# Altium footprint library DBLib.PcbLib: 99 footprints (part 4 of 7)
Each footprint in its own frame and in the unit in brackets; x right, y up, seen from the top. Pads: shape width x height; smd on the part's side, far side on the other; paste and mask are expansions set on the pad; w line width, h text height; cw(c..) or ccw(c..) is an arc to the next point about the centre after c.
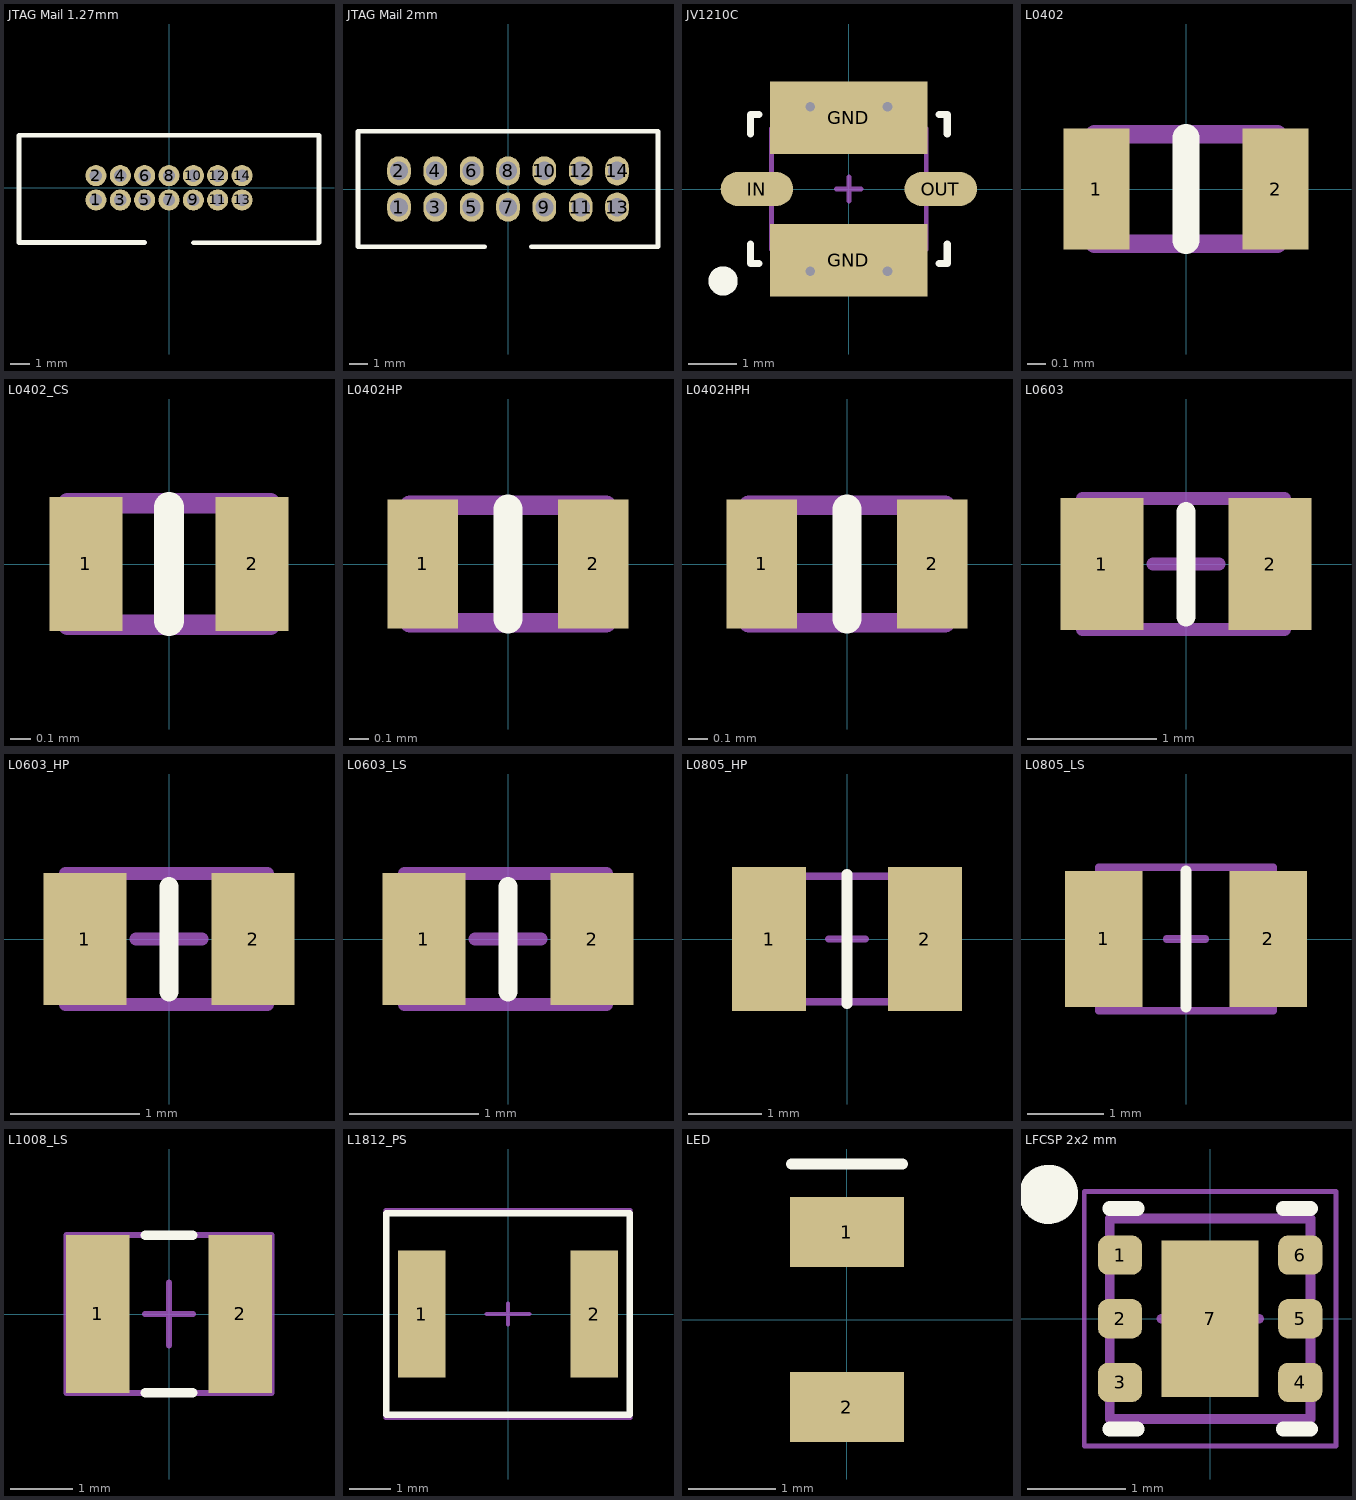
[diagram p3: the footprints below, top view; thin cyan lines are the x and y axes]

## JTAG Mail 1.27mm [mm]
height 2.9
pads (14):
  round 1.1 hole 0.65: 1(-3.81,-0.635) 2(-3.81,0.635) 3(-2.54,-0.635) 4(-2.54,0.635) 5(-1.27,-0.635) 6(-1.27,0.635) 7(0,-0.635) 8(0,0.635) 9(1.27,-0.635) 10(1.27,0.635) 11(2.54,-0.635) 12(2.54,0.635) 13(3.81,-0.635) 14(3.81,0.635)
Top Overlay:
  lines w0.254: -1.27,-2.855 -7.823,-2.855 -7.823,2.743 7.823,2.743 7.823,-2.866 1.27,-2.866
3D body "User Library-CONB127P-2R-20W_TH.step": height 5.4, standoff -2.1, extent -7.595,-2.65 7.595,2.55

## JTAG Mail 2mm [mm] "2.00mm Pitch, Milli-Grid PCB Header, Dual Row, Vertical, Through Hole, Shrouded, 14  Circuits"
height 2.9
pads (14):
  oval 1.3x1.6 hole 1: 1(-6,-1) 2(-6,1) 3(-4,-1) 4(-4,1) 5(-2,-1) 6(-2,1) 7(0,-1) 8(0,1) 9(2,-1) 10(2,1) 11(4,-1) 12(4,1) 13(6,-1) 14(6,1)
Top Overlay:
  lines w0.254: -1.27,-3.175 -8.255,-3.175 -8.255,3.175 8.255,3.175 8.255,-3.175 1.27,-3.175
3D body "878311421.stp": height 6.45, standoff -2.45, extent -8.325,-3.15 8.325,3.15

## JV1210C [mm] "Bandpass Filter"
height 1.5
pads (4):
  rect 3.25x1.5 smd: GND(0,-1.475) GND(0,1.475)
  oval 1.5x0.7 smd: IN(-1.9,0) OUT(1.9,0)
via 0.8,1.7 diameter 0.5 hole 0.2
via -0.8,1.7 diameter 0.5 hole 0.2
via 0.8,-1.7 diameter 0.5 hole 0.2
via -0.8,-1.7 diameter 0.5 hole 0.2
Top Overlay:
  circle w0.35: c-2.6,-1.9 r0.127
  lines w0.15: -2.032,-1.138 -2.032,-1.538 -1.863,-1.538 ; -2.032,1.138 -2.032,1.538 -1.863,1.538 ; 1.863,-1.538 2.032,-1.538 2.032,-1.138 ; 1.863,1.538 2.032,1.538 2.032,1.138
Mechanical 1:
  lines w0.1: -0.254,0 0.254,0 ; 0,-0.254 0,0.254 ; -1.6,-1.25 1.6,-1.25 1.6,1.25 -1.6,1.25 -1.6,-1.25
3D body "User Library-CAPC3225X13.step": height 1.3, standoff 0, extent -1.6,-1.25 1.6,1.25

## L0402 [mm]
height 1.3
pads (2):
  rect 0.36x0.66 smd: 1(-0.49,0) 2(0.49,0)
Top Overlay:
  lines w0.15: 0,-0.279 0,0.279
Mechanical 1:
  lines w0.1: -0.5,-0.3 0.5,-0.3 0.5,0.3 -0.5,0.3 -0.5,-0.3
3D body "Coilcraft-0402DF.step": height 0.66, standoff 0, extent -0.559,-0.325 0.559,0.335

## L0402_CS [mm]
height 1.3
pads (2):
  rect 0.36x0.66 smd: 1(-0.41,0) 2(0.41,0)
Top Overlay:
  lines w0.15: 0,-0.279 0,0.279
Mechanical 1:
  lines w0.1: -0.5,-0.3 0.5,-0.3 0.5,0.3 -0.5,0.3 -0.5,-0.3
3D body "Coilcraft-0402CS.step": height 0.65, standoff -0.01, extent -0.593,-0.318 0.593,0.318

## L0402HP [mm]
height 1.3
pads (2):
  rect 0.36x0.66 smd: 1(-0.435,0) 2(0.435,0)
Top Overlay:
  lines w0.15: 0,-0.279 0,0.279
Mechanical 1:
  lines w0.1: -0.5,-0.3 -0.5,0.3 0.5,0.3 0.5,-0.3 -0.5,-0.3
3D body "Ind_Coilcraft_0402HP-22NXGLU_eec.STEP": height 0.61, standoff 0, extent -0.546,-0.305 0.546,0.305

## L0402HPH [mm]
height 1.3
pads (2):
  rect 0.36x0.66 smd: 1(-0.435,0) 2(0.435,0)
Top Overlay:
  lines w0.15: 0,-0.279 0,0.279
Mechanical 1:
  lines w0.1: -0.5,-0.3 0.5,-0.3 0.5,0.3 -0.5,0.3 -0.5,-0.3
3D body "Ind_Coilcraft_0402HPH-R10XJLU_eec.STEP": height 0.6, standoff -0.01, extent -0.56,-0.325 0.56,0.335

## L0603 [mm]
height 1.3
pads (2):
  rect 0.64x1.02 smd: 1(-0.65,0) 2(0.65,0)
Top Overlay:
  lines w0.15: 0,-0.406 0,0.406
Mechanical 1:
  lines w0.1: -0.254,0 0.254,0 ; 0,-0.254 0,0.254 ; -0.8,-0.508 0.762,-0.508 0.762,0.508 -0.8,0.508 -0.8,-0.508
3D body "User Library-SLF_0603.step": height 1, standoff -0.02, extent -0.9,-0.56 0.9,0.56

## L0603_HP [mm]
height 1.3
pads (2):
  rect 0.64x1.02 smd: 1(-0.65,0) 2(0.65,0)
Top Overlay:
  lines w0.15: 0,-0.406 0,0.406
Mechanical 1:
  lines w0.1: -0.254,0 0.254,0 ; 0,-0.254 0,0.254 ; -0.8,-0.508 0.762,-0.508 0.762,0.508 -0.8,0.508 -0.8,-0.508
3D body "Coilcraft-0603HP.step": height 0.93, standoff -0.01, extent -0.875,-0.545 0.875,0.545

## L0603_LS [mm]
height 1.3
pads (2):
  rect 0.64x1.02 smd: 1(-0.65,0) 2(0.65,0)
Top Overlay:
  lines w0.15: 0,-0.406 0,0.406
Mechanical 1:
  lines w0.1: -0.254,0 0.254,0 ; 0,-0.254 0,0.254 ; -0.8,-0.508 -0.8,0.508 0.762,0.508 0.762,-0.508 -0.8,-0.508
3D body "Coilcraft-0603LS.step": height 1.11, standoff -0.01, extent -0.901,-0.584 0.901,0.585

## L0805_HP [mm]
height 1.3
pads (2):
  rect 1.02x1.98 smd: 1(-1.07,0) 2(1.07,0)
Top Overlay:
  lines w0.15: 0,-0.889 0,0.889
Mechanical 1:
  lines w0.1: -0.254,0 0.254,0 ; 0,-0.254 0,0.254 ; -1.145,-0.862 1.144,-0.862 1.144,0.863 -1.145,0.863 -1.145,-0.862
3D body "Coilcraft-0805CS.step": height 1.51, standoff -0.01, extent -1.145,-0.862 1.144,0.863

## L0805_LS [mm]
height 1.3
pads (2):
  rect 1.02x1.78 smd: 1(-1.08,0) 2(1.08,0)
Top Overlay:
  lines w0.15: 0,-0.889 0,0.889
Mechanical 1:
  lines w0.1: -0.254,0 0.254,0 ; 0,-0.254 0,0.254 ; -1.145,-0.94 1.144,-0.94 1.144,0.94 -1.145,0.94 -1.145,-0.94
3D body "Coilcraft-0805LS.step": height 1.59, standoff -0.01, extent -1.145,-0.955 1.145,0.955

## L1008_LS [mm]
height 1.3
pads (2):
  rect 1.02x2.54 smd: 1(-1.145,0) 2(1.145,0)
Top Overlay:
  lines w0.15: -0.381,-1.27 0.381,-1.27 ; -0.381,1.27 0.381,1.27
Mechanical 1:
  lines w0.1: -0.381,0 0.381,0 ; 0,-0.508 0,0.508 ; -1.651,-1.27 1.651,-1.27 1.651,1.27 -1.651,1.27 -1.651,-1.27
3D body "Coilcraft-1008LS.step": height 2.02, standoff -0.01, extent -1.46,-1.395 1.46,1.395

## L1812_PS [mm]
height 1.3
pads (2):
  rect 1.14x3.05 smd: 1(-2.07,0) 2(2.07,0)
Top Overlay:
  lines w0.15: -2.921,-2.413 2.921,-2.413 2.921,2.413 -2.921,2.413 -2.921,-2.413
Mechanical 1:
  lines w0.1: -0.508,0 0.508,0 ; 0,-0.254 0,0.254 ; -2.93,-2.49 2.93,-2.49 2.93,2.49 -2.93,2.49 -2.93,-2.49
3D body "Coilcraft-1812PS.step": height 3.8, standoff -0.01, extent -2.93,-2.49 2.93,2.49

## LED [mm] "2012"
pads (2):
  rect 1.3x0.8 smd: 1(0,1) 2(0,-1)
Top Overlay:
  lines w0.127: -0.635,1.778 0.635,1.778
3D body "APHCM2012.STEP": height 0.4, standoff -0.01, extent -0.625,-1 0.625,1

## LFCSP 2x2 mm [mm] "LFCSP, 6-Leads, Body 2,00x2,00mm, Pitch 0,65mm, Thermal Pad 1,60x0,99mm, IPC Medium Density"
height 0.9
pads (7):
  rrect50% 0.45x0.4 smd: 1(-0.92,0.65) 2(-0.92,0) 3(-0.92,-0.65) 4(0.92,-0.65) 5(0.92,0) 6(0.92,0.65)
  rect 0.99x1.6 smd: 7(0,0)
Top Overlay:
  circle w0.35: c-1.651,1.27 r0.127
  lines w0.15: -1.025,-1.125 -0.745,-1.125 ; -1.025,1.125 -0.745,1.125 ; 0.745,-1.125 1.025,-1.125 ; 0.745,1.125 1.025,1.125
Mechanical 1:
  lines w0.05: -1.285,-1.3 1.285,-1.3 1.285,1.3 -1.285,1.3 -1.285,-1.3
  lines w0.1: -0.5,0 0.5,0 ; 0,-0.5 0,0.5 ; -1.025,-1.025 1.025,-1.025 1.025,1.025 -1.025,1.025 -1.025,-1.025
3D body "User Library-LFCSP_UD6.step": height 0.65, standoff 0, extent -1.05,-1.005 1.05,0.995